# Altium footprint library Nanjar's Library.PcbLib: 153 footprints (part 9 of 10)
Each footprint in its own frame and in the unit in brackets; x right, y up, seen from the top. Pads: shape width x height; smd on the part's side, far side on the other; paste and mask are expansions set on the pad; w line width, h text height; cw(c..) or ccw(c..) is an arc to the next point about the centre after c.
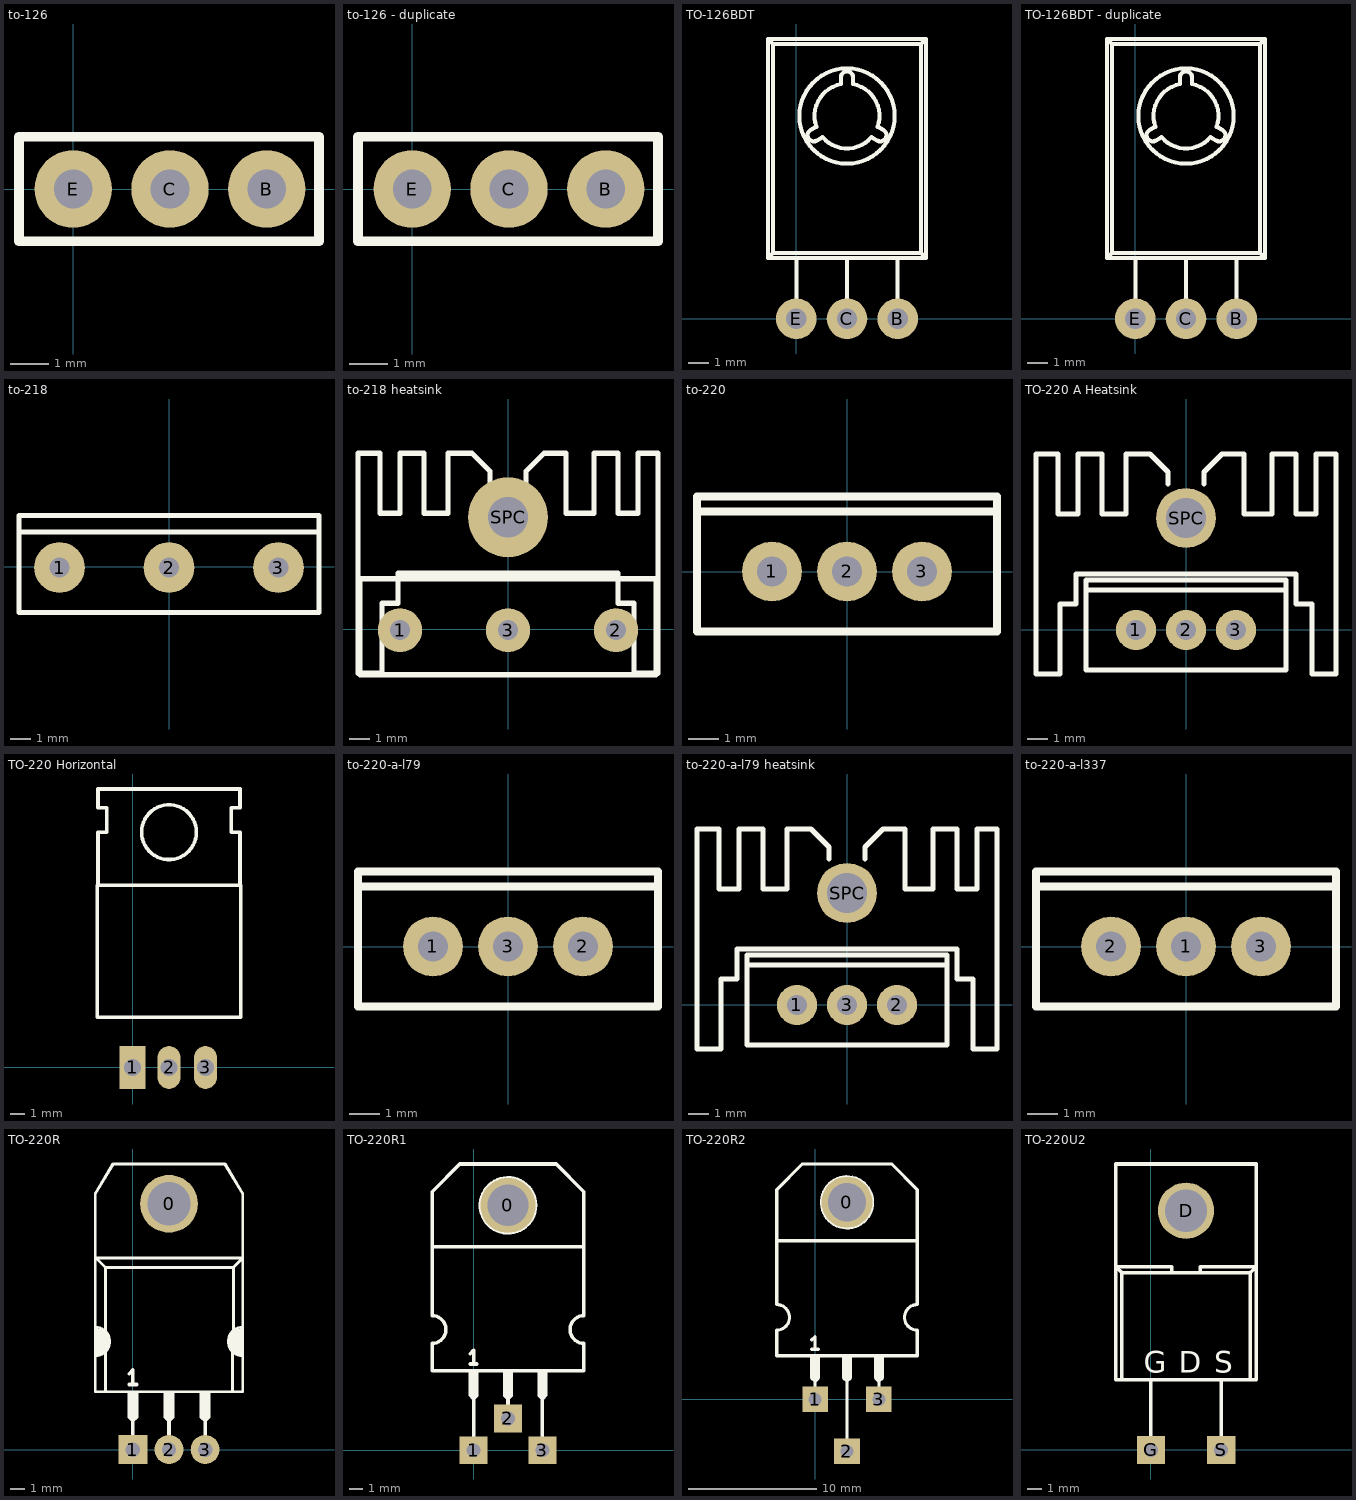
[diagram p8: the footprints below, top view; thin cyan lines are the x and y axes]

## to-126 [mm]
pads (3):
  round 2 hole 1: B(5,0) C(2.5,0) E(0,0)
Top Overlay:
  lines w0.254: -1.4,-1.35 6.35,-1.35 6.35,1.35 -1.4,1.35 -1.4,-1.35
3D body "Tugas222.step": height 13.09, standoff -0.96, extent -1.4,-1.2 6.4,1.2

## to-126 - duplicate [mm]
pads (3):
  round 2 hole 1: B(5,0) C(2.5,0) E(0,0)
Top Overlay:
  lines w0.254: -1.4,-1.35 -1.4,1.35 6.35,1.35 6.35,-1.35 -1.4,-1.35
3D body "User Library-BD135 (TO-126,SOT32) v4.STEP": height 15.6, standoff -2.35, extent -1.4,-1.35 6.4,1.35

## TO-126BDT [mm]
pads (3):
  round 2 hole 1: B(5,0) C(2.5,0) E(0,0)
Top Overlay:
  circle w0.2: c2.5,10 r2.35
  lines w0.2: 0,1 0,3 ; 0.964,9.46 0.705,9.31 ccw(c0.855,9.05) 1.005,8.79 1.264,8.94 ; 0.991,9.469 cw(c2.5,10) 2.205,11.573 ; 1.286,8.958 ccw(c2.5,10) 3.714,8.958 ; 2.5,1 2.5,3 ; 2.795,11.573 cw(c2.5,10) 4.009,9.469 ; 3.736,8.94 3.995,8.79 ccw(c4.145,9.05) 4.295,9.31 4.036,9.46 ; 5,1 5,3 ; -1.4,3 -1.15,3.25 ; -1.4,3 6.4,3 ; -1.4,3 -1.4,13.8 ; -1.4,13.8 -1.15,13.55 ; -1.4,13.8 6.4,13.8 ; -1.15,3.25 -1.15,13.55 ; -1.15,3.25 6.15,3.25 ; -1.15,13.55 6.15,13.55 ; 2.2,11.9 cw(c2.5,11.9) 2.8,11.9 ; 2.2,11.9 cw(c2.5,11.9) 2.8,11.9 ; 2.2,11.9 2.2,11.6 2.2,11.9 ; 2.8,11.9 2.8,11.6 2.8,11.9 ; 6.15,3.25 6.4,3 ; 6.15,3.25 6.15,13.55 ; 6.15,13.55 6.4,13.8 ; 6.4,3 6.4,13.8
3D body: height 1.5, standoff 1, extent 4.6,-0.25 5.4,0.248
3D body: height 1.5, standoff 1, extent 4.3,0.775 5.4,3.2
3D body: height 1.25, standoff -1.5, extent 4.6,-0.251 5.4,0.249
3D body: height 1.5, standoff 1, extent 4.6,0 5.4,0.775
3D body: height 1.5, standoff 1, extent 2.1,-0.249 2.9,0.249
3D body: height 1.5, standoff 1, extent 1.8,0.776 3.2,3.201
3D body: height 1.25, standoff -1.5, extent 2.1,-0.25 2.9,0.25
3D body: height 1.5, standoff 1, extent 2.1,0.001 2.9,0.776
3D body: height 1.5, standoff 1, extent -0.4,0 0.4,0.775
3D body: height 1.25, standoff -1.5, extent -0.4,-0.251 0.4,0.249
3D body: height 1.5, standoff 1, extent -0.4,0.775 0.7,3.2
3D body: height 1.5, standoff 1, extent -0.4,-0.25 0.4,0.248
3D body: height 2.4, standoff 0, extent -1.4,3 2.5,13.8
3D body: height 2.4, standoff 0, extent 2.5,3 6.4,13.8

## TO-126BDT - duplicate [mm]
pads (3):
  round 2 hole 1: B(5,0) C(2.5,0) E(0,0)
Top Overlay:
  circle w0.2: c2.5,10 r2.35
  lines w0.2: 0,1 0,3 ; 0.964,9.46 0.705,9.31 ccw(c0.855,9.05) 1.005,8.79 1.264,8.94 ; 0.991,9.469 cw(c2.5,10) 2.205,11.573 ; 1.286,8.958 ccw(c2.5,10) 3.714,8.958 ; 2.5,1 2.5,3 ; 2.795,11.573 cw(c2.5,10) 4.009,9.469 ; 3.736,8.94 3.995,8.79 ccw(c4.145,9.05) 4.295,9.31 4.036,9.46 ; 5,1 5,3 ; -1.4,3 -1.15,3.25 ; -1.4,3 6.4,3 ; -1.4,3 -1.4,13.8 ; -1.4,13.8 -1.15,13.55 ; -1.4,13.8 6.4,13.8 ; -1.15,3.25 -1.15,13.55 ; -1.15,3.25 6.15,3.25 ; -1.15,13.55 6.15,13.55 ; 2.2,11.9 cw(c2.5,11.9) 2.8,11.9 ; 2.2,11.9 cw(c2.5,11.9) 2.8,11.9 ; 2.2,11.9 2.2,11.6 2.2,11.9 ; 2.8,11.9 2.8,11.6 2.8,11.9 ; 6.15,3.25 6.4,3 ; 6.15,3.25 6.15,13.55 ; 6.15,13.55 6.4,13.8 ; 6.4,3 6.4,13.8
3D body: height 1.5, standoff 1, extent 4.6,-0.25 5.4,0.248
3D body: height 1.5, standoff 1, extent 4.3,0.775 5.4,3.2
3D body: height 1.5, standoff 1, extent 4.6,0 5.4,0.775
3D body: height 1.5, standoff 1, extent 2.1,-0.249 2.9,0.249
3D body: height 1.5, standoff 1, extent 1.8,0.776 3.2,3.201
3D body: height 1.5, standoff 1, extent 2.1,0.001 2.9,0.776
3D body: height 1.5, standoff 1, extent -0.4,0 0.4,0.775
3D body: height 1.5, standoff 1, extent -0.4,0.775 0.7,3.2
3D body: height 1.5, standoff 1, extent -0.4,-0.25 0.4,0.248
3D body: height 2.4, standoff 0, extent -1.4,3 2.5,13.8
3D body: height 2.4, standoff 0, extent 2.5,3 6.4,13.8

## to-218 [mm]
pads (3):
  round 2.5 hole 1: 1(-5.4,-0.05) 2(0,-0.05) 3(5.4,-0.05)
Top Overlay:
  lines w0.254: -7.4,1.7 7.4,1.7 ; -7.4,-2.275 -7.4,2.525 7.4,2.525 7.4,-2.275 -7.4,-2.275
3D body "User Library-BD135 (TO-126,SOT32) v4.STEP": height 15.6, standoff -2.35, extent -3.05,4.2 4.75,6.9

## to-218 heatsink [mm]
pads (4):
  round 2.2 hole 1: 1(-5.4,-0.05) 2(5.4,-0.05) 3(0,-0.05)
  round 4 hole 2: SPC(0,5.6)
Top Overlay:
  lines w0.254: -7.5,2.8 -7.5,-2.2 ; -6.5,-2.2 -7.5,-2.2 ; -6.4,5.8 -5.4,5.8 -5.4,8.8 -4.2,8.8 -4.2,5.8 -3.2,5.8 -3,5.8 -3,8.8 -1.8,8.8 -0.9,7.9 -0.9,7.3 ; -6.4,5.9 -6.4,8.8 -7.5,8.8 -7.5,-2.2 ; 0.9,7.3 0.9,7.9 1.8,8.8 2.9,8.8 2.9,5.8 4.3,5.8 ; 3.3,5.8 4.3,5.8 ; 6.5,-2.2 7.5,-2.2 ; -7.5,-2.2 -6.3,-2.2 -6.3,1.3 -5.5,1.3 -5.5,2.8 5.5,2.8 5.5,1.3 6.3,1.3 6.3,-2.2 7.5,-2.2 ; 4.3,5.8 4.3,8.8 5.5,8.8 5.5,5.8 6.5,5.8 6.5,8.8 7.5,8.8 7.5,2.8 7.5,-2.2 ; -7.4,-2.275 -7.4,2.525 7.4,2.525 7.4,-2.275 -7.4,-2.275

## to-220 [mm]
pads (3):
  round 2 hole 1: 1(-2.5,0) 2(0,0) 3(2.5,0)
Top Overlay:
  lines w0.254: -5,2 5,2 ; -5,-2 -5,-1.5 -5,2.5 5,2.5 5,-2 -5,-2

## TO-220 A Heatsink [mm]
pads (4):
  round 2 hole 1: 1(-2.5,0) 2(0,0) 3(2.5,0)
  round 3 hole 2: SPC(0,5.6)
Top Overlay:
  lines w0.254: -7.5,2.8 -7.5,-2.2 ; -6.5,-2.2 -7.5,-2.2 ; -6.4,5.8 -5.4,5.8 -5.4,8.8 -4.2,8.8 -4.2,5.8 -3.2,5.8 -3,5.8 -3,8.8 -1.8,8.8 -0.9,7.9 -0.9,7.3 ; -6.4,5.9 -6.4,8.8 -7.5,8.8 -7.5,-2.2 ; -5,2 5,2 ; 0.9,7.3 0.9,7.7 0.9,7.9 1.8,8.8 2.9,8.8 2.9,5.8 4.3,5.8 ; 3.3,5.8 4.3,5.8 ; 6.5,-2.2 7.5,-2.2 ; -7.5,-2.2 -6.3,-2.2 -6.3,1.3 -5.5,1.3 -5.5,2.8 5.5,2.8 5.5,1.3 6.3,1.3 6.3,-2.2 7.5,-2.2 ; 4.3,5.8 4.3,8.8 5.5,8.8 5.5,5.8 6.5,5.8 6.5,8.8 7.5,8.8 7.5,2.8 7.5,-2.2 ; -5,-2 5,-2 5,2.5 -5,2.5 -5,-1.5 -5,-2

## TO-220 Horizontal [mm] "TO-220 Horizontal"
pads (3):
  rect 1.8x3 hole 1.2: 1(0,0)
  oval 1.6x3 hole 1.2: 2(2.54,0) 3(5.08,0)
Top Overlay:
  lines w0.254: -2.41,12.7 -2.41,16.4 -1.81,16.4 ; -1.81,16.41 -1.81,18.11 -2.41,18.11 -2.41,19.41 2.54,19.41 7.49,19.41 7.49,18.11 6.89,18.11 6.89,16.41 ; 7.49,19.4 7.49,18.1 6.89,18.1 6.89,16.4 ; 6.89,16.4 7.49,16.4 ; 6.89,16.4 7.49,16.4 ; 7.49,16.4 7.49,12.7 7.49,16.4 ; -2.46,3.5 -2.46,12.7 7.54,12.7 7.54,3.5 -2.46,3.5 ; 4.45,16.4 ccw(c2.54,16.399) 4.45,16.399
3D body: height 2.9, standoff 2.4, extent 4.43,2 5.73,3.5
3D body: height 2.9, standoff 2.4, extent 4.305,1 5.855,2
3D body: height 2.65, standoff -1.5, extent 4.58,-0.25 5.58,0.25
3D body: height 2.9, standoff 2.4, extent 4.38,0 5.78,1
3D body: height 2.9, standoff 2.4, extent 4.58,-0.25 5.58,0.248
3D body: height 2.9, standoff 2.4, extent 1.89,2 3.19,3.5
3D body: height 2.9, standoff 2.4, extent 1.765,1 3.315,2
3D body: height 2.65, standoff -1.5, extent 2.04,-0.25 3.04,0.25
3D body: height 2.9, standoff 2.4, extent 1.84,0 3.24,1
3D body: height 2.9, standoff 2.4, extent 2.04,-0.25 3.04,0.248
3D body: height 2.9, standoff 2.4, extent -0.5,-0.25 0.5,0.248
3D body: height 2.9, standoff 2.4, extent -0.7,0 0.7,1
3D body: height 2.65, standoff -1.5, extent -0.5,-0.25 0.5,0.25
3D body: height 2.9, standoff 2.4, extent -0.775,1 0.775,2
3D body: height 2.9, standoff 2.4, extent -0.65,2 0.65,3.5
3D body: height 4.5, standoff 0, extent -0.475,3.501 5.547,12.7
3D body: height 4.5, standoff 0.5, extent 3.555,3.499 7.539,12.699
3D body: height 4.5, standoff 0.5, extent -2.459,3.499 1.525,12.699
3D body: height 2.5, standoff 0, extent -2.459,3.501 7.539,12.699
3D body: height 1.3, standoff 0, extent 2.54,12.7 7.49,19.41
3D body: height 1.3, standoff 0, extent -2.41,12.7 2.54,19.41

## to-220-a-l79 [mm]
pads (3):
  round 2 hole 1: 1(-2.5,0) 2(2.5,0) 3(0,0)
Top Overlay:
  lines w0.254: -5,2 5,2 ; -5,-2 -5,-1.5 -5,2.5 5,2.5 5,-2 -5,-2

## to-220-a-l79 heatsink [mm]
pads (4):
  round 2 hole 1: 1(-2.5,0) 2(2.5,0) 3(0,0)
  round 3 hole 2: SPC(0,5.6)
Top Overlay:
  lines w0.254: -7.5,2.8 -7.5,-2.2 ; -6.5,-2.2 -7.5,-2.2 ; -6.4,5.8 -5.4,5.8 -5.4,8.8 -4.2,8.8 -4.2,5.8 -3.2,5.8 -3,5.8 -3,8.8 -1.8,8.8 -0.9,7.9 -0.9,7.3 ; -6.4,5.9 -6.4,8.8 -7.5,8.8 -7.5,-2.2 ; -5,2 5,2 ; 0.9,7.3 0.9,7.9 1.8,8.8 2.9,8.8 2.9,5.8 4.3,5.8 ; 3.3,5.8 4.3,5.8 ; 6.5,-2.2 7.5,-2.2 ; -7.5,-2.2 -6.3,-2.2 -6.3,1.3 -5.5,1.3 -5.5,2.8 5.5,2.8 5.5,1.3 6.3,1.3 6.3,-2.2 7.5,-2.2 ; 4.3,5.8 4.3,8.8 5.5,8.8 5.5,5.8 6.5,5.8 6.5,8.8 7.5,8.8 7.5,2.8 7.5,-2.2 ; -5,-2 -5,-1.5 -5,2.5 5,2.5 5,-2 -5,-2

## to-220-a-l337 [mm]
pads (3):
  round 2 hole 1: 1(0,0) 2(-2.5,0) 3(2.5,0)
Top Overlay:
  lines w0.254: -5,2 5,2 ; -5,-2 5,-2 5,2.5 -5,2.5 -5,-1.5 -5,-2

## TO-220R [mm]
pads (4):
  round 4 hole 3: 0(2.5,17)
  rect 2x2 hole 1: 1(0,0)
  round 2 hole 1: 2(2.5,0) 3(5,0)
Top Overlay:
  lines w0.2: -2.6,6.475 ccw(c-2.6,7.475) -2.6,8.475 ; -2.573,6.821 ccw(c-2.6,7.5) -2.544,8.177 ; -2.556,7.306 ccw(c-2.575,7.5) -2.494,7.678 ; -2.552,7.377 -2.552,7.99 cw(c-2.575,7.475) -2.518,6.963 ; -2.55,7.83 cw(c-2.55,7.475) -2.506,7.122 ; -2.55,8.286 cw(c-2.55,7.475) -2.498,6.665 ; -1.9,4 -1.9,6.75 ; 6.9,4 6.9,6.75 ; 6.95,8.25 6.95,12.6 ; 7.494,7.678 ccw(c7.575,7.5) 7.556,7.306 ; 7.498,6.665 cw(c7.55,7.475) 7.55,8.286 ; 7.506,7.122 cw(c7.55,7.475) 7.55,7.83 ; 7.518,6.963 cw(c7.575,7.475) 7.552,7.99 7.552,7.377 ; 7.544,8.177 ccw(c7.6,7.5) 7.573,6.821 ; -1.9,8.2 -1.9,8.2 ; -1.9,8.2 -1.9,12.6 ; -1.9,12.6 6.95,12.6 ; -1.9,12.6 -2.55,13.25 -2.6,13.25 2.5,13.25 7.6,13.25 6.95,12.6 ; -2.6,4 7.6,4 7.6,17.7 6.375,19.75 2.5,19.75 -1.375,19.75 -2.6,17.7 -2.6,4 ; 6.9,8.2 6.9,8.2 ; 7.6,6.475 cw(c7.6,7.475) 7.6,8.475 ccw(c7.6,7.475) 7.6,6.475
  lines w0.254: -0.25,3.95 -0.25,2.25 0,2 ; -0.25,4.5 0.25,4.5 ; -0.25,5.25 0,5.5 0,4.5 ; 0,1 0,2 ; 0,2.25 0,3.95 ; 0.25,3.95 0.25,2.25 0,2 ; 2.25,3.95 2.25,2.25 2.5,2 ; 2.5,1 2.5,2 ; 2.5,2.25 2.5,3.9 ; 2.75,3.95 2.75,2.25 2.5,2 ; 4.75,3.95 4.75,2.25 5,2 ; 5,1 5,2 ; 5,2.25 5,3.95 ; 5.25,3.95 5.25,2.25 5,2
3D body: height 4.5, standoff 0.5, extent 3.515,3.999 7.499,13.199
3D body: height 2.9, standoff 2.4, extent 4.557,0 5.444,1.6
3D body: height 2.65, standoff -1.5, extent 4.556,-0.25 5.444,0.25
3D body: height 2.9, standoff 2.4, extent 4.3,1.6 5.7,4
3D body: height 2.9, standoff 2.4, extent 4.557,-0.248 5.444,0.25
3D body: height 2.9, standoff 2.4, extent 2.057,0 2.944,1.6
3D body: height 2.65, standoff -1.5, extent 2.056,-0.25 2.944,0.25
3D body: height 2.9, standoff 2.4, extent 1.8,1.6 3.2,4
3D body: height 2.9, standoff 2.4, extent 2.057,-0.248 2.944,0.25
3D body: height 2.9, standoff 2.4, extent -0.443,-0.248 0.444,0.25
3D body: height 2.9, standoff 2.4, extent -0.7,1.6 0.7,4
3D body: height 2.65, standoff -1.5, extent -0.444,-0.25 0.444,0.25
3D body: height 2.9, standoff 2.4, extent -0.443,0 0.444,1.6
3D body: height 1.1, standoff 0, extent -2.5,13.2 2.5,19.65
3D body: height 2.5, standoff 0, extent -2.499,4 7.499,13.199
3D body: height 4.5, standoff 0.5, extent -2.499,3.999 1.485,13.199
3D body: height 4.5, standoff 0, extent -0.515,4.001 5.507,13.2
3D body: height 1.1, standoff 0, extent 2.5,13.2 7.5,19.65

## TO-220R1 [mm]
pads (4):
  round 4 hole 3: 0(2.5,17.75)
  rect 2x2 hole 1: 1(0,0) 2(2.5,2.3) 3(5,0)
Top Overlay:
  circle w0.254: c2.5,17.75 r2
  lines w0.254: -3,14.75 8,14.75 ; -0.25,5.75 -0.25,4 0,3.75 ; -0.25,6.25 0.25,6.25 ; -0.25,7 0,7.25 0,6.25 ; 0,0.75 0,3.2 ; 0,2.75 0,3.75 ; 0,4 0,5.75 ; 0.25,5.75 0.25,4 0,3.75 ; 2.25,5.75 2.25,4 2.5,3.75 2.75,4 2.75,5.75 ; 2.5,4 2.5,5.75 ; 2.5,3.2 2.5,3.8 ; 4.75,5.75 4.75,4 5,3.75 ; 5,0.75 5,3 ; 5,2.75 5,3.75 ; 5,4 5,5.75 ; 5.25,5.75 5.25,4 5,3.75 ; -3,5.75 -3,7.75 ccw(c-3,8.75) -3,9.75 -3,18.75 -1,20.75 6,20.75 8,18.75 8,9.75 ccw(c8,8.75) 8,7.75 8,5.75 -3,5.75

## TO-220R2 [mm]
pads (4):
  round 4 hole 3: 0(2.5,15.425)
  rect 2x2 hole 1: 1(0,0) 2(2.5,-4.05) 3(5,0)
Top Overlay:
  circle w0.254: c2.5,15.425 r2
  lines w0.254: -3,12.425 8,12.425 ; -0.25,3.425 -0.25,1.675 0,1.425 ; -0.25,3.925 0.25,3.925 ; -0.25,4.675 0,4.925 0,3.925 ; 0,0.425 0,1.425 ; 0,1.675 0,3.425 ; 0.25,3.425 0.25,1.675 0,1.425 ; 2.25,3.425 2.25,1.675 2.5,1.425 2.75,1.675 2.75,3.425 ; 2.5,-3.1 2.5,0.9 ; 2.5,0.875 2.5,1.475 ; 2.5,1.675 2.5,3.425 ; 4.75,3.425 4.75,1.675 5,1.425 ; 5,0.425 5,1.425 ; 5,1.675 5,3.425 ; 5.25,3.425 5.25,1.675 5,1.425 ; -3,3.425 -3,5.425 ccw(c-3,6.425) -3,7.425 -3,16.425 -1,18.425 6,18.425 8,16.425 8,7.425 ccw(c8,6.425) 8,5.425 8,3.425 -3,3.425

## TO-220U2 [mm]
pads (3):
  round 4 hole 3: D(2.502,16.99)
  rect 2x2 hole 1: G(0.002,-0.01) S(5.002,-0.01)
Top Overlay:
  lines w0.25: -2.5,16.5 -2.5,19.04 -2.5,20.31 7.5,20.31 7.5,19.04 7.5,16.5 7.502,16.5 7.502,12.99 7.502,4.99 -2.498,4.99 -2.498,12.99 -2.498,16.46 ; -2.45,13 -2.45,12.975 -2.05,12.575 7.075,12.575 7.5,13 ; -2.4,13 1.5,13 1.5,12.6 ; -2.075,5 -2.05,5.025 -2.05,12.55 ; 0.002,0.99 0.002,4.99 ; 3.5,12.6 3.5,13 7.4,13 ; 5.002,0.99 5.002,4.99 ; 7.075,5 7.075,12.6
  text "G" at -0.498,5.49 h1.52
  text "S" at 4.502,5.49 h1.52
  text "D" at 2.002,5.49 h1.52